# Altium integrated library CbyP.IntLib: 1144 symbols (part 5 of 6)
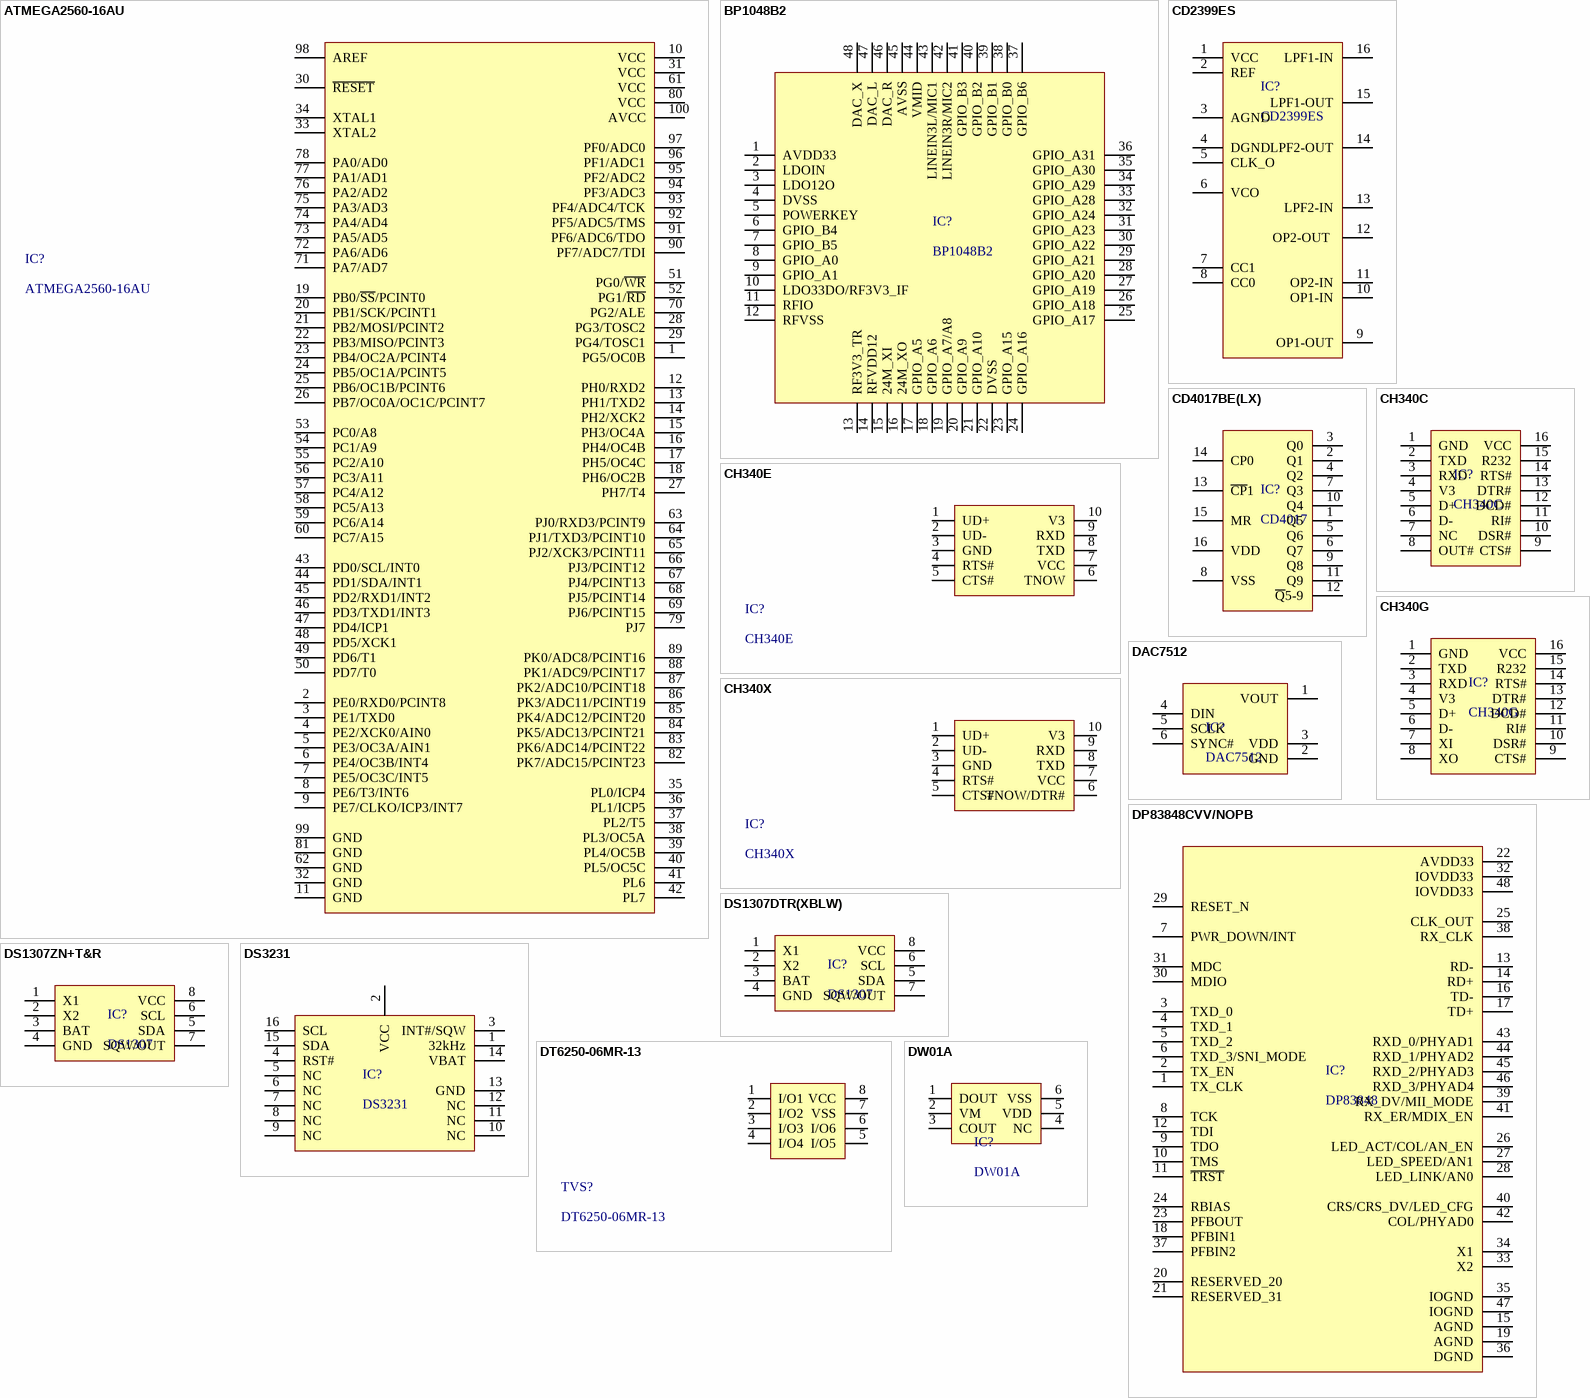
[diagram p45: symbols ATMEGA2560-16AU to DW01A]

## DW01A
designator IC?
Battery Protection IC Lithium-ion/Polymer SOT23-6; Manufacturer: HL; Package: SOT23-6; LCSC Part #: C18164398; Mfr.Part #: DW01A; DigiKey Part Number: NO
footprint SOT23-6
pins: 1 DOUT, 2 VM, 3 COUT (power), 4 NC (power), 5 VDD (power), 6 VSS

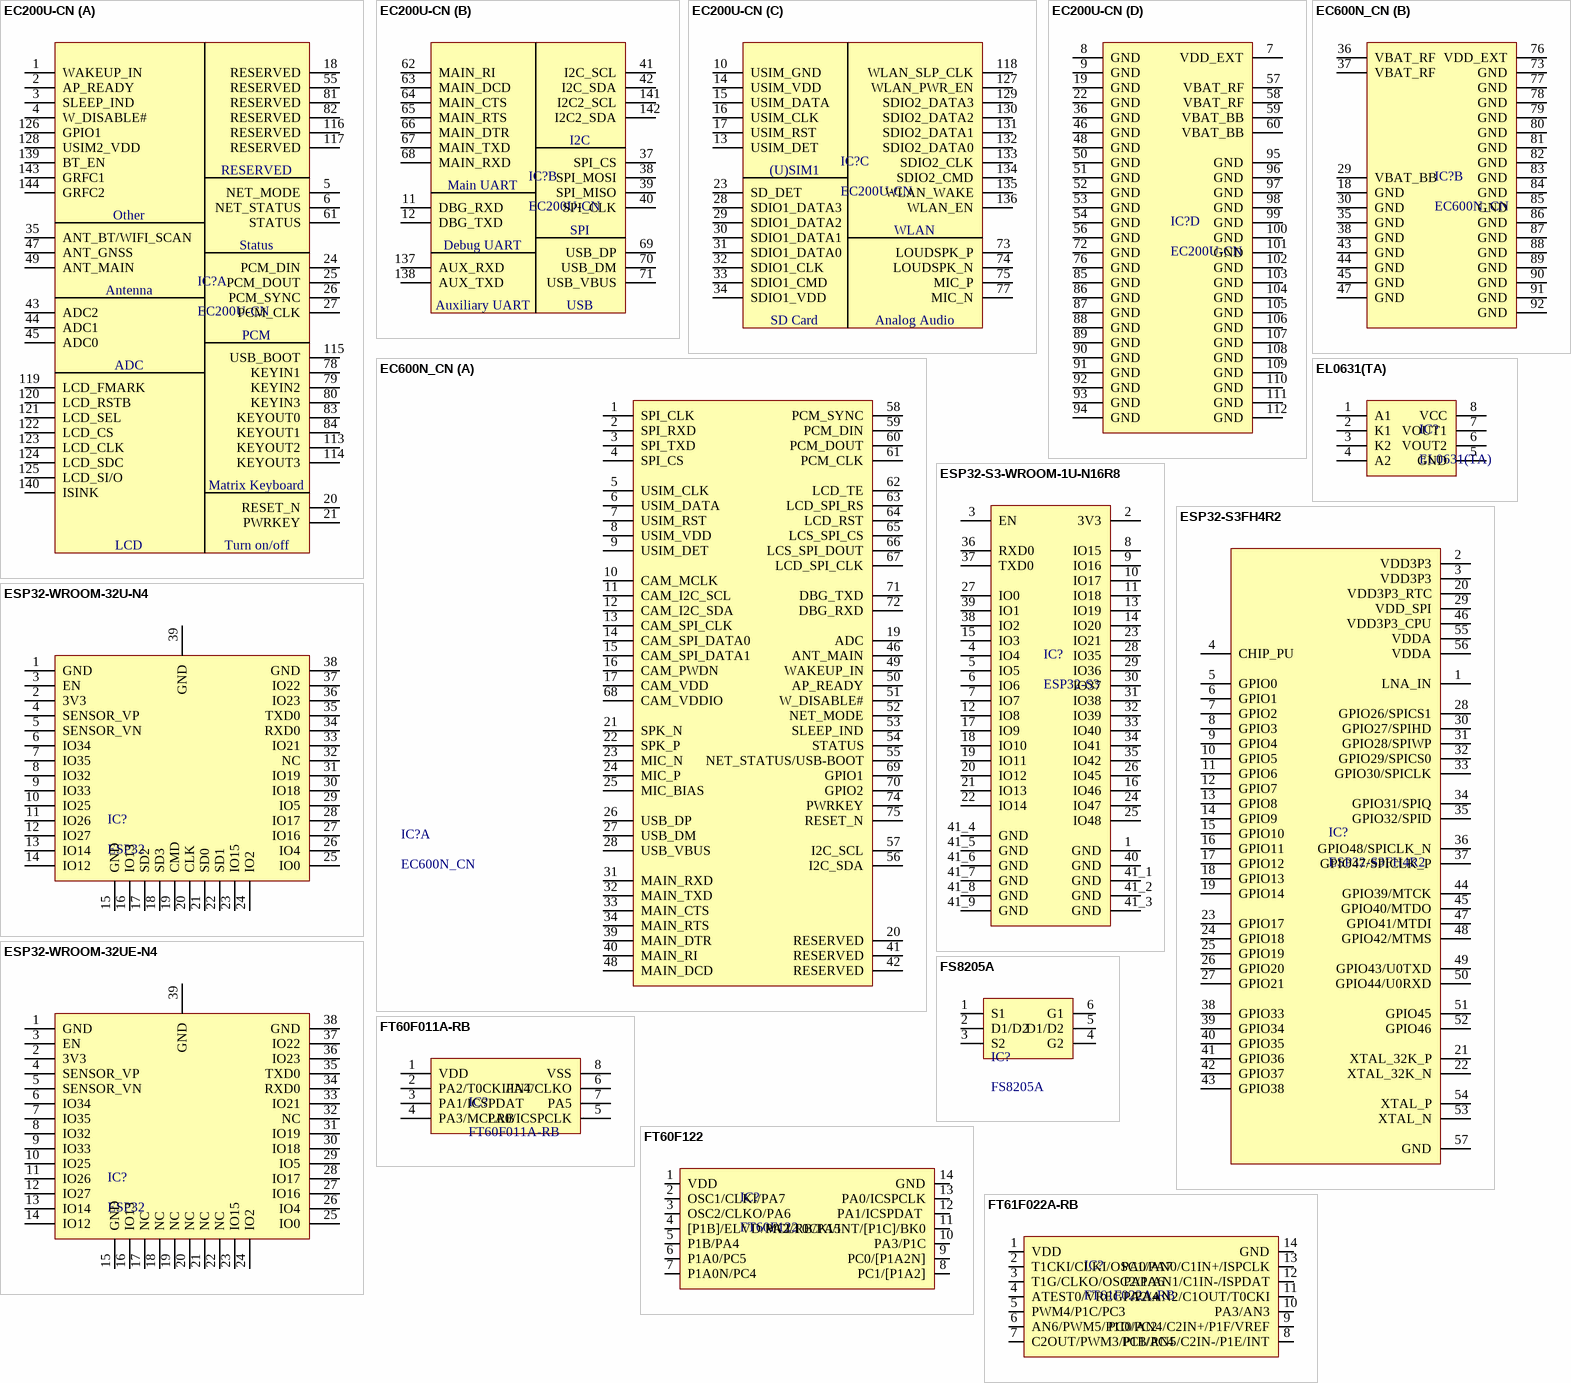
[diagram p27: symbols EC200U-CN to FT61F022A-RB]

## EC200U-CN
designator IC?
Transceiver Module; Manufacturer: QUECTEL; Mfr.Part #: EC200UCNAA-N05-SGNSA; So_Chan_Dan: 144; So_Chan_Cam: 0; Package: LQFP-64(10x10); Name: EC200U-CN
footprint EC200U-XX
part A pins: 1 WAKEUP_IN, 2 AP_READY, 3 SLEEP_IND, 4 W_DISABLE#, 5 NET_MODE, 6 NET_STATUS, 18 RESERVED, 20 RESET_N, 21 PWRKEY, 24 PCM_DIN, 25 PCM_DOUT, 26 PCM_SYNC, 27 PCM_CLK, 35 ANT_BT/WIFI_SCAN, 43 ADC2, 44 ADC1, 45 ADC0, 47 ANT_GNSS, 49 ANT_MAIN, 55 RESERVED, 61 STATUS, 78 KEYIN1, 79 KEYIN2, 80 KEYIN3, 81 RESERVED, 82 RESERVED, 83 KEYOUT0, 84 KEYOUT1, 113 KEYOUT2, 114 KEYOUT3, 115 USB_BOOT, 116 RESERVED, 117 RESERVED, 119 LCD_FMARK, 120 LCD_RSTB, 121 LCD_SEL, 122 LCD_CS, 123 LCD_CLK, 124 LCD_SDC, 125 LCD_SI/O, 126 GPIO1, 128 USIM2_VDD, 139 BT_EN, 140 ISINK, 143 GRFC1, 144 GRFC2
part B pins: 11 DBG_RXD, 12 DBG_TXD, 37 SPI_CS, 38 SPI_MOSI, 39 SPI_MISO, 40 SPI_CLK, 41 I2C_SCL, 42 I2C_SDA, 62 MAIN_RI, 63 MAIN_DCD, 64 MAIN_CTS, 65 MAIN_RTS, 66 MAIN_DTR, 67 MAIN_TXD, 68 MAIN_RXD, 69 USB_DP, 70 USB_DM, 71 USB_VBUS, 137 AUX_RXD, 138 AUX_TXD, 141 I2C2_SCL, 142 I2C2_SDA
part C pins: 10 USIM_GND, 13 USIM_DET, 14 USIM_VDD, 15 USIM_DATA, 16 USIM_CLK, 17 USIM_RST, 23 SD_DET, 28 SDIO1_DATA3, 29 SDIO1_DATA2, 30 SDIO1_DATA1, 31 SDIO1_DATA0, 32 SDIO1_CLK, 33 SDIO1_CMD, 34 SDIO1_VDD, 73 LOUDSPK_P, 74 LOUDSPK_N, 75 MIC_P, 77 MIC_N, 118 WLAN_SLP_CLK, 127 WLAN_PWR_EN, 129 SDIO2_DATA3, 130 SDIO2_DATA2, 131 SDIO2_DATA1, 132 SDIO2_DATA0, 133 SDIO2_CLK, 134 SDIO2_CMD, 135 WLAN_WAKE, 136 WLAN_EN
part D pins: 7 VDD_EXT, 8 GND, 9 GND, 19 GND, 22 GND, 36 GND, 46 GND, 48 GND, 50 GND, 51 GND, 52 GND, 53 GND, 54 GND, 56 GND, 57 VBAT_RF, 58 VBAT_RF, 59 VBAT_BB, 60 VBAT_BB, 72 GND, 76 GND, 85 GND, 86 GND, 87 GND, 88 GND, 89 GND, 90 GND, 91 GND, 92 GND, 93 GND, 94 GND, 95 GND, 96 GND, 97 GND, 98 GND, 99 GND, 100 GND, 101 GND, 102 GND, 103 GND, 104 GND, 105 GND, 106 GND, 107 GND, 108 GND, 109 GND, 110 GND, 111 GND, 112 GND
part A text: Other; Status; Antenna; PCM; ADC; Matrix Keyboard; LCD; Turn on/off
part B text: I2C; Main UART; SPI; Debug UART; Auxiliary UART; USB
part C text: (U)SIM1; WLAN; SD Card; Analog Audio

## EC600N_CN
designator IC?
Transceiver Module; Manufacturer: QUECTEL; Package: EC600N_CN; Mfr.Part #: EC600N_CN; LCSC Part #: NO; DigiKey Part Number: NO
footprint EC600N-CN_R1.1
part A pins: 1 SPI_CLK, 2 SPI_RXD, 3 SPI_TXD, 4 SPI_CS, 5 USIM_CLK, 6 USIM_DATA, 7 USIM_RST, 8 USIM_VDD, 9 USIM_DET, 10 CAM_MCLK, 11 CAM_I2C_SCL, 12 CAM_I2C_SDA, 13 CAM_SPI_CLK, 14 CAM_SPI_DATA0, 15 CAM_SPI_DATA1, 16 CAM_PWDN, 17 CAM_VDD, 19 ADC, 20 RESERVED, 21 SPK_N, 22 SPK_P, 23 MIC_N, 24 MIC_P, 25 MIC_BIAS, 26 USB_DP, 27 USB_DM, 28 USB_VBUS, 31 MAIN_RXD, 32 MAIN_TXD, 33 MAIN_CTS, 34 MAIN_RTS, 39 MAIN_DTR, 40 MAIN_RI, 41 RESERVED, 42 RESERVED, 46 ANT_MAIN, 48 MAIN_DCD, 49 WAKEUP_IN, 50 AP_READY, 51 W_DISABLE#, 52 NET_MODE, 53 SLEEP_IND, 54 STATUS, 55 NET_STATUS/USB-BOOT, 56 I2C_SDA, 57 I2C_SCL, 58 PCM_SYNC, 59 PCM_DIN, 60 PCM_DOUT, 61 PCM_CLK, 62 LCD_TE, 63 LCD_SPI_RS, 64 LCD_RST, 65 LCS_SPI_CS, 66 LCS_SPI_DOUT, 67 LCD_SPI_CLK, 68 CAM_VDDIO, 69 GPIO1, 70 GPIO2, 71 DBG_TXD, 72 DBG_RXD, 74 PWRKEY, 75 RESET_N
part B pins: 18 GND, 29 VBAT_BB, 30 GND, 35 GND, 36 VBAT_RF, 37 VBAT_RF, 38 GND, 43 GND, 44 GND, 45 GND, 47 GND, 73 GND, 76 VDD_EXT, 77 GND, 78 GND, 79 GND, 80 GND, 81 GND, 82 GND, 83 GND, 84 GND, 85 GND, 86 GND, 87 GND, 88 GND, 89 GND, 90 GND, 91 GND, 92 GND

## EL0631(TA)
designator IC?
10Mbit/s 100ns 7V 10kV/us DC SOP-8 Logic Output Optocoupler ROHS; Manufacturer: Everlight Elec; So_Chan_Dan: 8; So_Chan_Cam: 0; Mfr.Part #: EL0631(TA); Package: SOP-8; Name: EL0631(TA)
footprint SOIC-8-1
pins: 1 A1, 2 K1, 3 K2, 4 A2, 5 GND, 6 VOUT2, 7 VOUT1, 8 VCC

## ESP32-S3-WROOM-1U-N16R8
designator IC?, comment ESP32-S3
2.4GHz ESP32-S3R8 -103.5dBm SMD,19.2x18mm RF Transceiver Modules and Modems RoHS; Manufacturer: ESPRESSIF; Mfr.Part #: ESP32-S3-WROOM-1U-N16R8; Package: SMD,19.2x18mm; LCSC Part #: C3013946; DigiKey Part Number: 1965-ESP32-S3-WROOM-1U-N16R8TR-ND; ComponentLink1Description: Link; ComponentLink1URL: https://www.lcsc.com/product-detail/C3013946.html?s_z=n_c3013946; ComponentLink2Description: Link 1; ComponentLink2URL: https://www.digikey.com/en/products/detail/espressif-systems/ESP32-S3-WROOM-1U-N16R8/16162641
footprint ESP32-S3-WROOM-1U-N16R8
pins: 1 GND, 2 3V3, 3 EN, 4 IO4, 5 IO5, 6 IO6, 7 IO7, 8 IO15, 9 IO16, 10 IO17, 11 IO18, 12 IO8, 13 IO19, 14 IO20, 15 IO3, 16 IO46, 17 IO9, 18 IO10, 19 IO11, 20 IO12, 21 IO13, 22 IO14, 23 IO21, 24 IO47, 25 IO48, 26 IO45, 27 IO0, 28 IO35, 29 IO36, 30 IO37, 31 IO38, 32 IO39, 33 IO40, 34 IO41, 35 IO42, 36 RXD0, 37 TXD0, 38 IO2, 39 IO1, 40 GND, 41_1 GND, 41_2 GND, 41_3 GND, 41_4 GND, 41_5 GND, 41_6 GND, 41_7 GND, 41_8 GND, 41_9 GND

## ESP32-S3FH4R2
designator IC?
21dBm LX7 Chip 2.4GHz QFN-56(7x7) WiFi Modules ROHS; Manufacturer: Espressif Systems; Package: QFN-56(7x7); Mfr.Part #: ESP32-S3FH4R2; Name: ESP32-S3FH4R2
footprint QFN-56(7x7)
pins: 1 LNA_IN, 2 VDD3P3, 3 VDD3P3, 4 CHIP_PU, 5 GPIO0, 6 GPIO1, 7 GPIO2, 8 GPIO3, 9 GPIO4, 10 GPIO5, 11 GPIO6, 12 GPIO7, 13 GPIO8, 14 GPIO9, 15 GPIO10, 16 GPIO11, 17 GPIO12, 18 GPIO13, 19 GPIO14, 20 VDD3P3_RTC, 21 XTAL_32K_P, 22 XTAL_32K_N, 23 GPIO17, 24 GPIO18, 25 GPIO19, 26 GPIO20, 27 GPIO21, 28 GPIO26/SPICS1, 29 VDD_SPI, 30 GPIO27/SPIHD, 31 GPIO28/SPIWP, 32 GPIO29/SPICS0, 33 GPIO30/SPICLK, 34 GPIO31/SPIQ, 35 GPIO32/SPID, 36 GPIO48/SPICLK_N, 37 GPIO47/SPICLK_P, 38 GPIO33, 39 GPIO34, 40 GPIO35, 41 GPIO36, 42 GPIO37, 43 GPIO38, 44 GPIO39/MTCK, 45 GPIO40/MTDO, 46 VDD3P3_CPU, 47 GPIO41/MTDI, 48 GPIO42/MTMS, 49 GPIO43/U0TXD, 50 GPIO44/U0RXD, 51 GPIO45, 52 GPIO46, 53 XTAL_N, 54 XTAL_P, 55 VDDA, 56 VDDA, 57 GND

## ESP32-WROOM-32U-N4
designator IC?, comment ESP32
2.4GHz ESP32-DOWD -97dBm SMD,19.2x18mm RF Transceiver Modules and Modems RoHS; Manufacturer: ESPRESSIF; Mfr.Part #: ESP32-WROOM-32U-N4; Package: SMD,19.2x18mm; LCSC Part #: C328062; DigiKey Part Number: 1965-ESP32-WROOM-32U-N4TR-ND; ComponentLink1Description: Link; ComponentLink1URL: https://www.lcsc.com/product-detail/C328062.html?s_z=n_ESP32-WROOM-32; ComponentLink2Description: Link 1; ComponentLink2URL: https://www.digikey.com/en/products/detail/espressif-systems/ESP32-WROOM-32U-N4/9381719?s=N4IgTCBcDaIAQFEDKAFAzGAtAdQEoHl8BZTDAVUwDkAWEAXQF8g
footprint ESP32-WROOM-32U
pins: 1 GND, 2 3V3, 3 EN, 4 SENSOR_VP, 5 SENSOR_VN, 6 IO34, 7 IO35, 8 IO32, 9 IO33, 10 IO25, 11 IO26, 12 IO27, 13 IO14, 14 IO12, 15 GND, 16 IO13, 17 SD2, 18 SD3, 19 CMD, 20 CLK, 21 SD0, 22 SD1, 23 IO15, 24 IO2, 25 IO0, 26 IO4, 27 IO16, 28 IO17, 29 IO5, 30 IO18, 31 IO19, 32 NC, 33 IO21, 34 RXD0, 35 TXD0, 36 IO23, 37 IO22, 38 GND, 39 GND

## ESP32-WROOM-32UE-N4
designator IC?, comment ESP32
2.4GHz -88dBm SMD,19.2x18mm RF Transceiver Modules and Modems RoHS; Manufacturer: ESPRESSIF; Mfr.Part #: ESP32-WROOM-32UE-N4; Package: SMD,19.2x18mm; LCSC Part #: C701344; DigiKey Part Number: 1965-ESP32-WROOM-32UE-N4TR-ND; ComponentLink1Description: Link; ComponentLink1URL: https://www.lcsc.com/product-detail/C701344.html?s_z=n_q_C701344; ComponentLink2Description: Link 1; ComponentLink2URL: https://www.digikey.com/en/products/detail/espressif-systems/ESP32-WROOM-32UE-N4/11613136
footprint ESP32-WROOM-32U
pins: 1 GND, 2 3V3, 3 EN, 4 SENSOR_VP, 5 SENSOR_VN, 6 IO34, 7 IO35, 8 IO32, 9 IO33, 10 IO25, 11 IO26, 12 IO27, 13 IO14, 14 IO12, 15 GND, 16 IO13, 17 NC, 18 NC, 19 NC, 20 NC, 21 NC, 22 NC, 23 IO15, 24 IO2, 25 IO0, 26 IO4, 27 IO16, 28 IO17, 29 IO5, 30 IO18, 31 IO19, 32 NC, 33 IO21, 34 RXD0, 35 TXD0, 36 IO23, 37 IO22, 38 GND, 39 GND

## FS8205A
designator IC?
20V 9A 1.5W Surface Mount SOT-23-6; Manufacturer: TECH PUBLIC; Package: SOT-23-6; LCSC Part #: C2830320; Mfr.Part #: FS8205A; DigiKey Part Number: NO
footprint SOT23-6
pins: 1 S1, 2 D1/D2, 3 S2 (power), 4 G2 (power), 5 D1/D2 (power), 6 G1

## FT60F011A-RB
designator IC?
16MHz SOP-8 Microcontrollers (MCU/MPU/SOC) ROHS; Manufacturer: FMD(Fremont Micro Devices); So_Chan_Dan: 8; So_Chan_Cam: 0; Mfr.Part #: FT60F011A-RB; Package: SOIC-8; Name: FT60F011A-RB
footprint SOIC-8
pins: 1 VDD, 2 PA2/T0CKI/INT, 3 PA1/ICSPDAT, 4 PA3/MCLRB, 5 PA0/ICSPCLK, 6 PA4/CLKO, 7 PA5, 8 VSS

## FT60F122
designator IC?
SOP-14 Microcontrollers (MCU/MPU/SOC) ROHS; Manufacturer: FMD(Fremont Micro Devices); Name: FT61F022A-RB; So_Chan_Dan: 14; So_Chna_Cam: 0; Mfr.Part #: FT60F122; Package: SOIC-14
footprint SOP-14
pins: 1 VDD, 2 OSC1/CLKI/PA7, 3 OSC2/CLKO/PA6, 4 [P1B]/ELVD/MCLRB/PA5, 5 P1B/PA4, 6 P1A0/PC5, 7 P1A0N/PC4, 8 PC1/[P1A2], 9 PC0/[P1A2N], 10 PA3/P1C, 11 PA2/T0CKI/INT/[P1C]/BK0, 12 PA1/ICSPDAT , 13 PA0/ICSPCLK, 14 GND

## FT61F022A-RB
designator IC?
RISC 16MHz SOP-14 Microcontrollers (MCU/MPU/SOC) ROHS; Manufacturer: FMD(Fremont Micro Devices); So_Chan_Dan: 14; So_Chna_Cam: 0; Mfr.Part #: FT61F022A-RB; Package: SOIC-14; Name: FT61F022A-RB
footprint SOP-14
pins: 1 VDD, 2 T1CKI/CLKI/OSC1/PA7, 3 T1G/CLKO/OSC2/PA6, 4 ATEST0/VREGP/PA4, 5 PWM4/P1C/PC3, 6 AN6/PWM5/P1D/PC2, 7 C2OUT/PWM3/P1B/PC4, 8 PC1/AN5/C2IN-/P1E/INT, 9 PC0/AN4/C2IN+/P1F/VREF, 10 PA3/AN3, 11 PA2/AN2/C1OUT/T0CKI, 12 PA1/AN1/C1IN-/ISPDAT, 13 PA0/AN0/C1IN+/ISPCLK, 14 GND

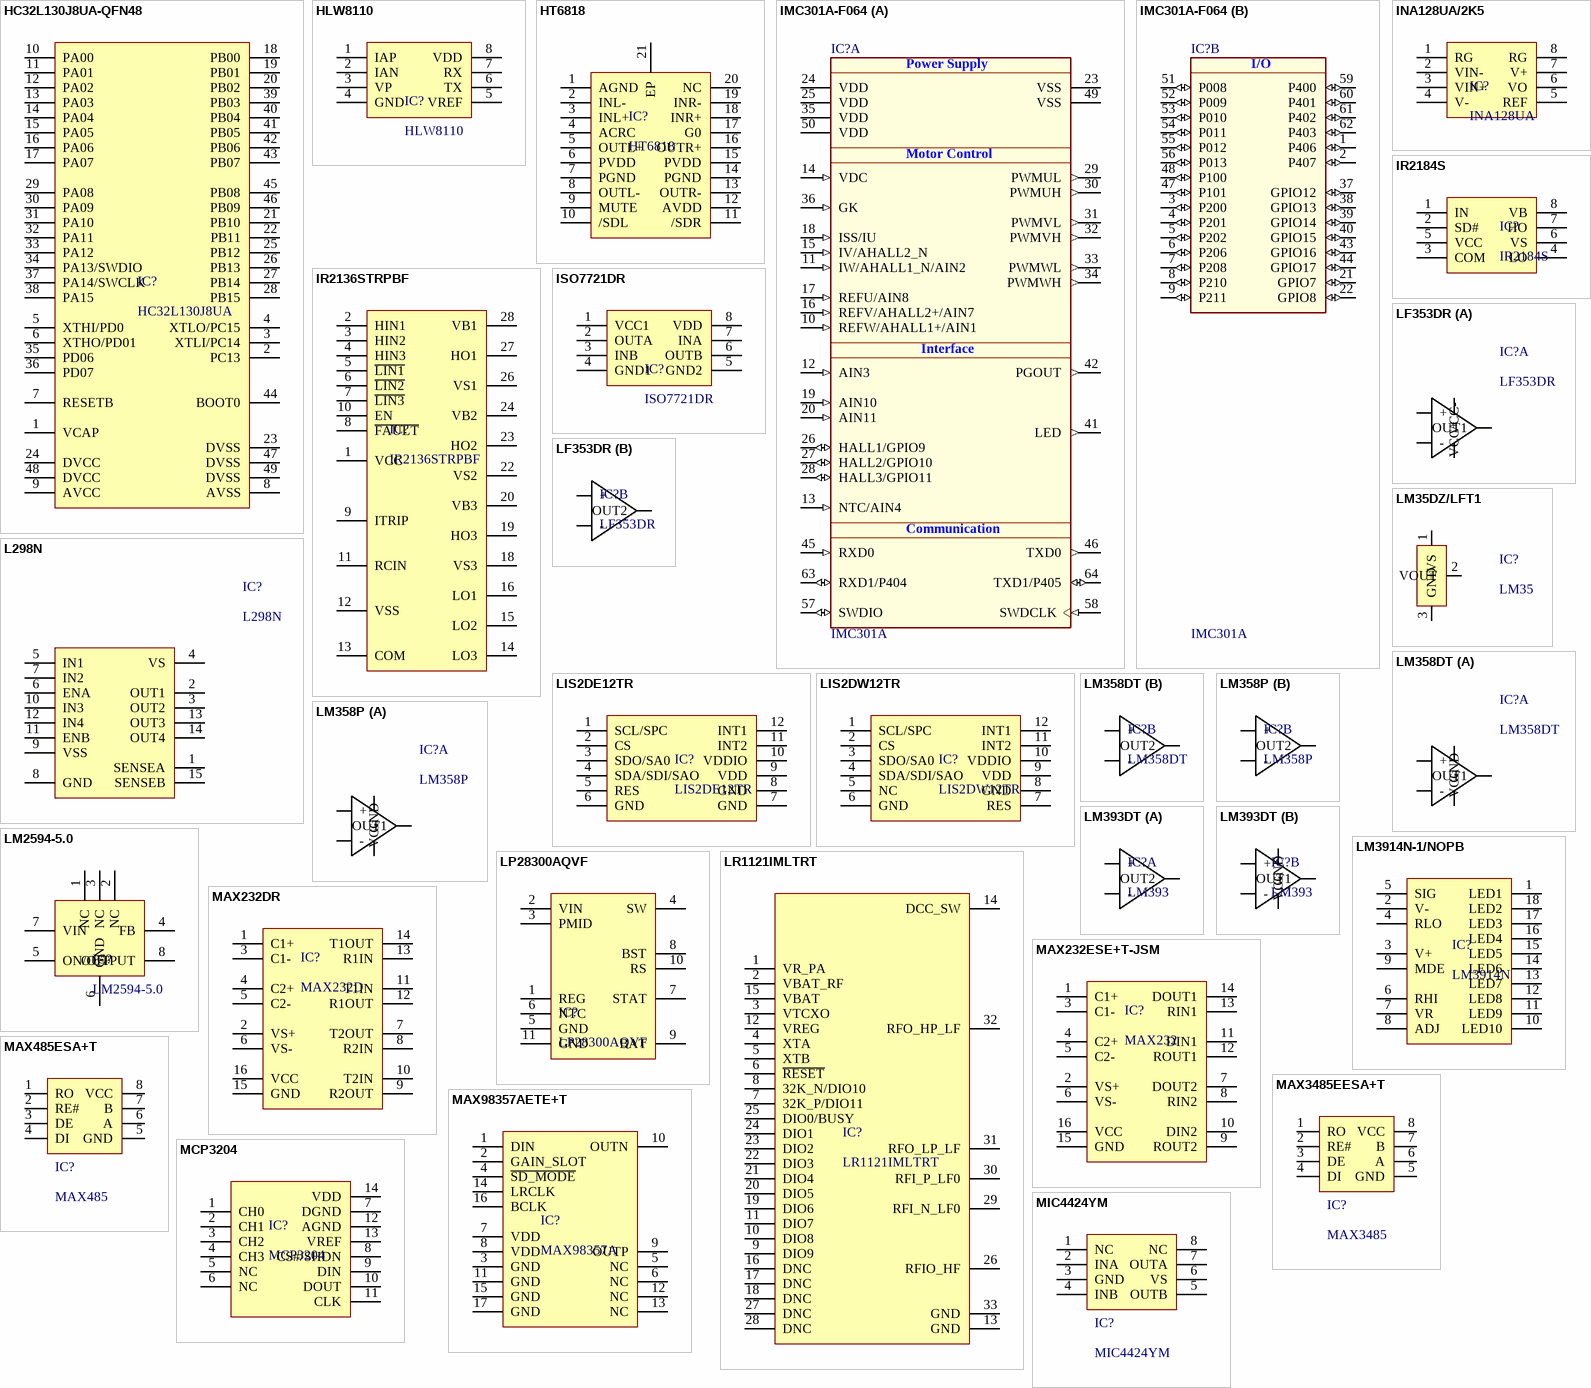
[diagram p28: symbols HC32L130J8UA-QFN48 to MIC4424YM]

## HC32L130J8UA-QFN48
designator IC?, comment HC32L130J8UA
ARM Cortex-M0 48MHz 40 QFN-48-EP(7x7) Microcontrollers RoHS; Mfr.Part #: HC32L130J8UA-QFN48; Manufacturer: XHSC; Package: QFN-48-EP(7x7); LCSC Part #: C784656; DigiKey Part Number: NO
footprint QFN-48-EP(7x7)-(HC32L130J8UA-QFN48)
pins: 1 VCAP, 2 PC13, 3 XTLI/PC14, 4 XTLO/PC15, 5 XTHI/PD0, 6 XTHO/PD01, 7 RESETB, 8 AVSS, 9 AVCC, 10 PA00, 11 PA01, 12 PA02, 13 PA03, 14 PA04, 15 PA05, 16 PA06, 17 PA07, 18 PB00, 19 PB01, 20 PB02, 21 PB10, 22 PB11, 23 DVSS, 24 DVCC, 25 PB12, 26 PB13, 27 PB14, 28 PB15, 29 PA08, 30 PA09, 31 PA10, 32 PA11, 33 PA12, 34 PA13/SWDIO, 35 PD06, 36 PD07, 37 PA14/SWCLK, 38 PA15, 39 PB03, 40 PB04, 41 PB05, 42 PB06, 43 PB07, 44 BOOT0, 45 PB08, 46 PB09, 47 DVSS, 48 DVCC, 49 DVSS

## HLW8110
designator IC?
UART SOP-8 Energy Metering RoHS; Manufacturer: Hiliwei Tech; Name: C970139; Mfr.Part #: HLW8110; Package: SOP-8
footprint SOIC-8
pins: 1 IAP, 2 IAN, 3 VP, 4 GND, 5 VREF, 6 TX, 7 RX, 8 VDD

## HT6818
designator IC?
Dual Channel 3.3Wx1@4Ω Class D Amplifier TSSOP-20-EP Audio Amplifiers ROHS; Manufacturer: Jiaxing Heroic Elec Tech; So_Chan_Dan: 21; So_Chna_Cam: 0; Mfr.Part #: HT6818; Package: TSSOP-20-EP; Name: HT6818; Link: https://www.lcsc.com/product-detail/Audio-Amplifiers_Jiaxing-Heroic-Elec-Tech-HT6818_C130782.html
footprint TSSOP-20-EP
pins: 1 AGND, 2 INL-, 3 INL+, 4 ACRC, 5 OUTL+, 6 PVDD, 7 PGND, 8 OUTL-, 9 MUTE, 10 /SDL, 11 /SDR, 12 AVDD, 13 OUTR-, 14 PGND, 15 PVDD, 16 OUTR+, 17 G0, 18 INR+, 19 INR-, 20 NC, 21 EP

## IMC301A-F064
designator IC?, comment IMC301A
High Performance motor control IC, Singe motor; Manufacturer: Infineon Technologies; Mfr.Part #: IMC301A-F064; Package: PG-LQFP-64
footprint LQFP-64(10x10)
part A pins: 10 REFW/AHALL1+/AIN1 (in) "Itrip phase W reference/Analog hall 1 negative input/Analog input 1", 11 IW/AHALL1_N/AIN2 (in) "Current sense input phase W/Analog input 2", 12 AIN3 (in) "Analog Hall sensor input", 13 NTC/AIN4 (in) "External thermistor input/Analog input 4", 14 VDC (in) "DC bus sensing input", 15 IV/AHALL2_N (in) "Current sense input phase V/analog input", 16 REFV/AHALL2+/AIN7 (in) "Itrip phase V reference/Analog hall 2 negative input/Analog input 7", 17 REFU/AIN8 (in) "Itrip phase U reference/Analog input 8", 18 ISS/IU (in) "Current sense input phase U / single shunt", 19 AIN10 (in) "Analog Hall sensor input", 20 AIN11 (in) "Analog Hall sensor input", 23 VSS (power) "Ground", 24 VDD (power) "Supply Voltage", 25 VDD (power) "Supply Voltage", 26 HALL1/GPIO9 (io) "Digital Hall sensor input1/User configurable I/O, digital", 27 HALL2/GPIO10 (io) "Digital Hall sensor input2/User configurable I/O, digital", 28 HALL3/GPIO11 (io) "Digital Hall sensor input3/User configurable I/O, digital", 29 PWMUL (out) "PWM output phase U low side", 30 PWMUH (out) "PWM output phase U high side", 31 PWMVL (out) "PWM output phase V low side", 32 PWMVH (out) "PWM output phase V high side", 33 PWMWL (out) "PWM output phase W low side", 34 PWMWH (out) "PWM output phase W high side", 35 VDD (power) "Supply Voltage", 36 GK (in) "Motor gate kill input", 41 LED (out) "Status LED", 42 PGOUT (out) "Pulse output", 45 RXD0 (in) "Serial port 0, receive input", 46 TXD0 (out) "Serial port 0, transmit output", 49 VSS (power) "Ground", 50 VDD (power) "Supply Voltage", 57 SWDIO (io) "User serial debug I/O", 58 SWDCLK (in) "User serial debug clock", 63 RXD1/P404 (io) "Serial port 1, receive input, programmable IO", 64 TXD1/P405 (io) "Serial port 1, transmit input, programmable IO"
part B pins: 1 P406 (io) "Programmable I/O", 2 P407 (io) "Programmable I/O", 3 P200 (io) "Programmable I/O or analog input", 4 P201 (io) "Programmable I/O or analog input", 5 P202 (io) "Programmable I/O or analog input", 6 P206 (io) "Programmable I/O or analog input", 7 P208 (io) "Programmable I/O or analog input", 8 P210 (io) "Programmable I/O or analog input", 9 P211 (io) "Programmable I/O or analog input", 21 GPIO7 (io), 22 GPIO8 (io), 37 GPIO12 (io) "User configurable I/O, digital", 38 GPIO13 (io) "User configurable I/O, digital", 39 GPIO14 (io) "User configurable I/O, digital", 40 GPIO15 (io) "User configurable I/O, digital", 43 GPIO16 (io) "User configurable I/O, digital", 44 GPIO17 (io) "User configurable I/O, digital", 47 P101 (io) "Programmable I/O", 48 P100 (io) "Programmable I/O", 51 P008 (io) "Programmable I/O", 52 P009 (io) "Programmable I/O", 53 P010 (io) "Programmable I/O", 54 P011 (io) "Programmable I/O", 55 P012 (io) "Programmable I/O", 56 P013 (io) "Programmable I/O", 59 P400 (io) "Programmable I/O", 60 P401 (io) "Programmable I/O", 61 P402 (io) "Programmable I/O", 62 P403 (io) "Programmable I/O"
part A text: Power Supply; Motor Control; Interface; Communication
part B text: I/O

## INA128UA/2K5
designator IC?, comment INA128UA
50uV 5nA 4V/us 120dB 1.3MHz 1 SOIC-8-150mil Amplifiers RoHS; Manufacturer: TI; Mfr.Part #: INA128UA/2K5; Package: SOIC-8-150mil; LCSC Part #: C22233; DigiKey Part Number: 296-26057-2-ND
footprint SOIC-8
pins: 1 RG, 2 VIN-, 3 VIN+, 4 V-, 5 REF, 6 VO, 7 V+, 8 RG

## IR2136STRPBF
designator IC?
Half Bridge 6 200mA 125ns 75ns 10V~20V 350mA SOIC-28-300mil Gate Drivers ROHS; Manufacturer: Infineon; Package: SOIC-28-300mil; Mfr.Part #: IR2136STRPBF
footprint SOIC-28-300mil
footprint TSSOP-28
pins: 1 VCC, 2 HIN1, 3 HIN2, 4 HIN3, 5 ~{LIN1}, 6 ~{LIN2}, 7 ~{LIN3}, 8 ~{FAULT}, 9 ITRIP, 10 EN, 11 RCIN, 12 VSS, 13 COM, 14 LO3, 15 LO2, 16 LO1, 18 VS3, 19 HO3, 20 VB3, 22 VS2, 23 HO2, 24 VB2, 26 VS1, 27 HO1, 28 VB1

## IR2184S
designator IC?
Half Bridge 2 1.9A 40ns 20ns 10V~20V 2.3A SOIC-8 Gate Drivers ROHS; Manufacturer: Infineon Technologies; Mfr.Part #: IR2184STRPBF; So_Chan_Dan: 8; So_Chan_Cam: 0; Package: SOP-8; Name: IR2184S
footprint SOIC-8
pins: 1 IN, 2 SD#, 3 COM, 4 LO, 5 VCC, 6 VS, 7 HO, 8 VB

## ISO7721DR
designator IC?
High-Speed, Robust EMC, Reinforced Dual-Channel Digital Isolators; Manufacturer: TI; Name: C366164; Mfr.Part #: ISO7721DR; Package: SOIC-8
footprint SOIC-8
pins: 1 VCC1, 2 OUTA, 3 INB, 4 GND1, 5 GND2, 6 OUTB, 7 INA, 8 VDD

## L298N
designator IC?
MultiwAtt-15 Stepper Motor Driver ROHS; Manufacturer: Texas Instruments; So_Chan_Dan: 0; So_Chan_Cam: 15; Mfr.Part #: L298N; Name: L298N; Package: MultiwAtt-15; Links: https://www.lcsc.com/product-detail/Stepper-Motor-Driver_STMicroelectronics-L298N_C19922.html?s_z=n_L298
footprint MultiwAtt-15
footprint MultiwAtt-15 + HEATSTINK
pins: 1 SENSEA, 2 OUT1, 3 OUT2, 4 VS, 5 IN1, 6 ENA, 7 IN2, 8 GND, 9 VSS, 10 IN3, 11 ENB, 12 IN4, 13 OUT3, 14 OUT4, 15 SENSEB

## LF353DR
designator IC?
5mV 50pA 13V/us 101dB 3MHz 3.6mA 2 SOIC-8 Amplifiers RoHS; Manufacturer: TI; Package: SOIC-8; Mfr.Part #: LF353DR; LCSC Part #: C7918; DigiKey Part Number: 296-14587-2-ND; ComponentLink1Description: Link; ComponentLink1URL: https://www.lcsc.com/product-detail/C7918.html?s_z=n_lf353; ComponentLink2Description: Link 1; ComponentLink2URL: https://www.digikey.com/en/products/detail/texas-instruments/LF353DR/555710
footprint SOIC-8
part A pins: 1 OUT1, 2 -, 3 +, 4 VCC- (power), 8 VCC+ (power)
part B pins: 5 +, 6 -, 7 OUT2

## LIS2DE12TR
designator IC?
X,Y,Z LGA-12(2x2) Accelerometers ROHS; Manufacturer: STMicroelectronics; So_Chan_Dan: 12; So_Chna_Cam: 0; Mfr.Part #: LIS2DE12TR; Package: LGA-12(2x2); Name: LIS2DE12TR
footprint LGA-12(2x2)
pins: 1 SCL/SPC, 2 CS, 3 SDO/SA0, 4 SDA/SDI/SAO, 5 RES, 6 GND, 7 GND, 8 GND, 9 VDD, 10 VDDIO, 11 INT2, 12 INT1

## LIS2DW12TR
designator IC?
X,Y,Z LGA-12(2x2) Accelerometers ROHS; Manufacturer: STMicroelectronics; So_Chan_Dan: 12; So_Chna_Cam: 0; Mfr.Part #: LIS2DW12TR; Package: LGA-12(2x2); Name: LIS2DW12TR
footprint LGA-12(2x2)
pins: 1 SCL/SPC, 2 CS, 3 SDO/SA0, 4 SDA/SDI/SAO, 5 NC, 6 GND, 7 RES, 8 GND, 9 VDD, 10 VDDIO, 11 INT2, 12 INT1

## LM35DZ/LFT1
designator IC?, comment LM35
4V~30V TO-92 Analog and Digital Output RoHS; Manufacturer: Texas Instruments; Mfr.Part #: LM35DZ/LFT1; Package: TO-92; LCSC Part #: C181511; DigiKey Part Number: 296-LM35DZ/LFT1TR-ND
footprint TO-92
pins: 1 +VS, 2 VOUT, 3 GND (power)

## LM358DT
designator IC?
20nA Dual 800kHz SOIC-8 Operational Amplifier ROHS; Manufacturer: STMicroelectronics; Package: SOIC-8; Mfr.Part #: LM358DT; LCSC Part #: C9418
footprint SOIC-8
part A pins: 1 OUT1, 2 -, 3 +, 4 GND (power), 8 VCC (power)
part B pins: 5 +, 6 -, 7 OUT2

## LM358P
designator IC?
Dual 20nA 0.3V/us 3mV DIP-8 Operational Amplifier ROHS; Manufacturer: STMicroelectronics; So_Chan_Dan: 8; So_Chan_Cam: 0; Package: DIP-8; Mfr.Part #: LM358P; Name: LM358P
footprint DIP-8
part A pins: 1 OUT1, 2 -, 3 +, 4 GND (power), 8 VCC (power)
part B pins: 5 +, 6 -, 7 OUT2

## LM393DT
designator IC?, comment LM393
Low power dual voltage comparators; Manufacturer: ST; Mfr.Part #: LM393DT; Package: SOIC-8; LCSC Part #: C32901
footprint SOIC-8
part A pins: 5 +, 6 -, 7 OUT2
part B pins: 1 OUT1, 2 -, 3 +, 4 GND (power), 8 VCC (power)

## LM2594-5.0
designator IC?
Step-down type Fixed 5V 4.5V~57V 1.5A SOP-8 DC-DC Converters ROHS; Manufacturer: UMW(Youtai Semiconductor Co., Ltd.); Mfr.Part #: LM2594HVM-5.0; So_Chan_Dan: 8; So_Chan_Cam: 0; Package: SOP-8; Name: LM2594-5.0
footprint SOIC-8
pins: 1 NC, 2 NC, 3 NC, 4 FB, 5 ON/OFF, 6 GND, 7 VIN, 8 OUTPUT

## LM3914N-1/NOPB
designator IC?, comment LM3914N
DIP-18 Digital Tube Drivers ROHS; Manufacturer: Texas Instruments; Mfr.Part #: LM3914N-1/NOPB; So_Chan_Dan: 18; So_Chan_Cam: 0; Package: DIP-18; Name: LM3914N-1/NOPB
footprint DIP-18
pins: 1 LED1, 2 V-, 3 V+, 4 RLO, 5 SIG, 6 RHI, 7 VR, 8 ADJ, 9 MDE, 10 LED10, 11 LED9, 12 LED8, 13 LED7, 14 LED6, 15 LED5, 16 LED4, 17 LED3, 18 LED2